# Altium schematic symbol library TI Power Management Shunt Voltage Reference.SchLib: 1526 symbols (part 1 of 18) (continued)
## LM285DRG4-1-2
designator U?
Micropower Voltage Reference, 1.235 V, 20 ppm / degC, 20 mA, -40 to 85 degC, 8-pin SOIC (D), Green (RoHS & no Sb/Br); Manufacturer: Texas Instruments; PartNumber: LM285DRG4-1-2; Initial Accuracy @ 25/deg C(%): 1; Iout/Iz(Max)(mA): 20; Min Iz for Regulation(uA): 10; Rating: Catalog; SubFamily: Shunt Voltage Reference; VO(V): 1.235; DatasheetVersion: SLVS075I; PackageVersion: 4040047-3/M; PackageReference: D8; PackageDescription: 8-Pin Plastic Small Outline, Body 4.9 x 3.9 mm, Pitch 1.27 mm; Supplier 1: Digi-Key; Supplier Part Number 1: LM285DRG4-1-2-ND; Supplier 2: Newark; Supplier Part Number 2: 41M3399; Supplier 3: Mouser; Supplier Part Number 3: 595-LM285DRG4-1-2; Eco-Plan: Green (RoHS & no Sb/Br); Temp Coeff(Typ)(ppm/ degree C): 20; Mounting Technology: Surface Mount; Code_JEDEC: MS-012; ComponentLink1Description: Manufacturer URL; ComponentLink1URL: http://www.ti.com/; ComponentLink2Description: Datasheet; ComponentLink2URL: http://www.ti.com/general/docs/lit/getliterature.tsp?genericPartNumber=LM285-1.2&fileType=pdf; ComponentLink3Description: Package Specification; ComponentLink3URL: http://www.ti.com/litv/pdf/msoi002j
footprint TI-D8_N (SOIC, 8-Leads, Body 4.9x3.9mm, Pitch 1.27mm, IPC Medium Density)
part A pins: 4 ANODE, 8 CATHODE
part B pins: 1 NC "No internal connection", 2 NC "No internal connection", 3 NC "No internal connection", 5 NC "No internal connection", 6 NC "No internal connection", 7 NC "No internal connection"

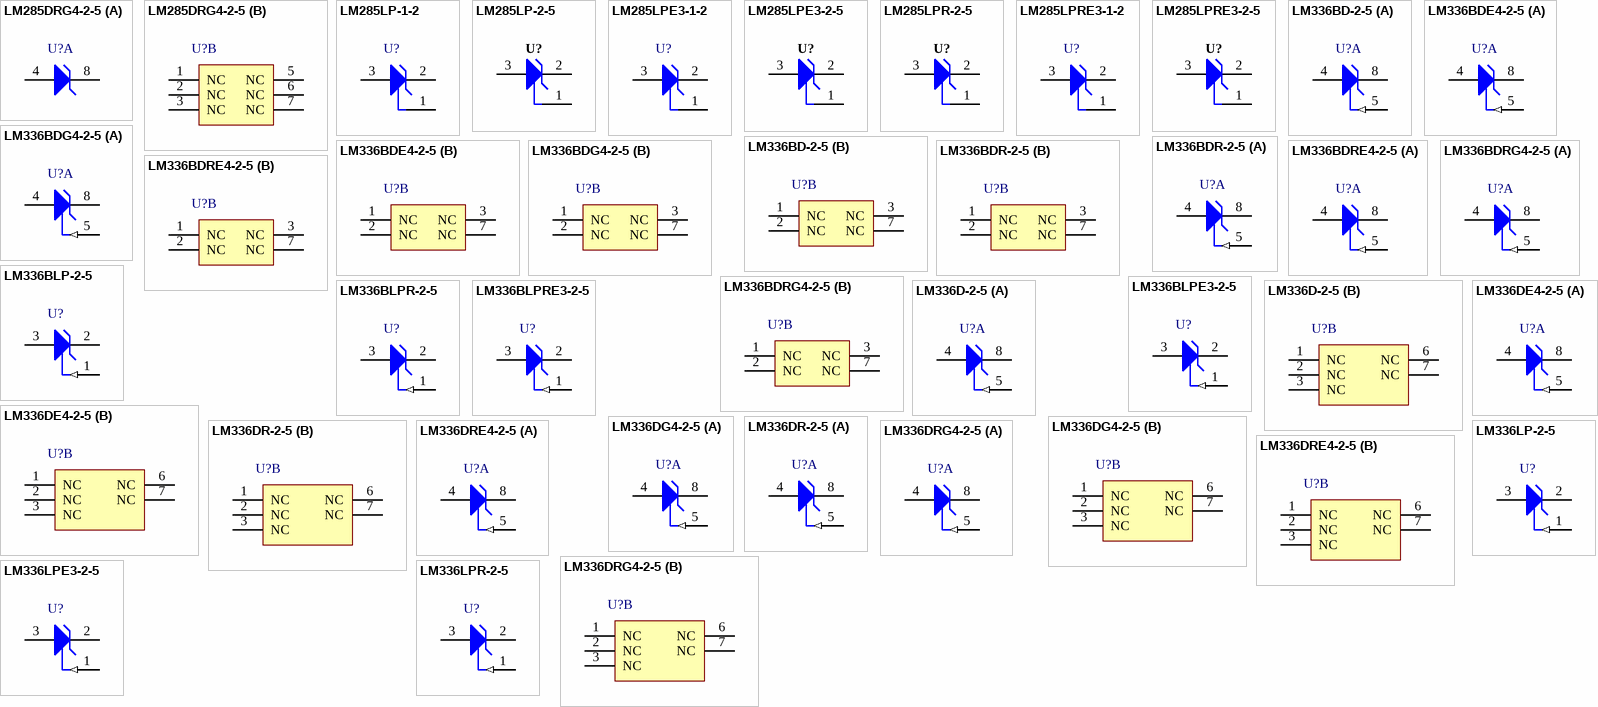
[diagram p1: symbols LM285DRG4-2-5 to LM336LPR-2-5]

## LM285DRG4-2-5
designator U?
Micropower Voltage Reference, 2.5 V, 20 ppm / degC, 20 mA, -40 to 85 degC, 8-pin SOIC (D), Green (RoHS & no Sb/Br); Manufacturer: Texas Instruments; PartNumber: LM285DRG4-2-5; Initial Accuracy @ 25/deg C(%): 1.5; Iout/Iz(Max)(mA): 20; Rating: Catalog; SubFamily: Shunt Voltage Reference; VO(V): 2.5; DatasheetVersion: SLVS023J; PackageVersion: 4040047-3/M; PackageReference: D8; PackageDescription: 8-Pin Plastic Small Outline, Body 4.9 x 3.9 mm, Pitch 1.27 mm; Supplier 1: Digi-Key; Supplier Part Number 1: LM285DRG4-2-5-ND; Supplier 2: Newark; Supplier Part Number 2: 41M3400; Supplier 3: Mouser; Supplier Part Number 3: 595-LM285DRG4-2-5; Eco-Plan: Green (RoHS & no Sb/Br); Min Iz for Regulation(uA): 20; Temp Coeff(Typ)(ppm/ degree C): 20; Mounting Technology: Surface Mount; Code_JEDEC: MS-012; ComponentLink1Description: Manufacturer URL; ComponentLink1URL: http://www.ti.com/; ComponentLink2Description: Datasheet; ComponentLink2URL: http://www.ti.com/general/docs/lit/getliterature.tsp?genericPartNumber=LM285-2.5&fileType=pdf; ComponentLink3Description: Package Specification; ComponentLink3URL: http://www.ti.com/litv/pdf/msoi002j
footprint TI-D8_N (SOIC, 8-Leads, Body 4.9x3.9mm, Pitch 1.27mm, IPC Medium Density)
part A pins: 4 ANODE, 8 CATHODE
part B pins: 1 NC "No internal connection", 2 NC "No internal connection", 3 NC "No internal connection", 5 NC "No internal connection", 6 NC "No internal connection", 7 NC "No internal connection"

## LM285LP-1-2
designator U?
Micropower Voltage Reference, 1.235 V, 20 ppm / degC, 20 mA, -40 to 85 degC, 3-pin TO-92 (LP), Pb-Free (RoHS); Manufacturer: Texas Instruments; PartNumber: LM285LP-1-2; Initial Accuracy @ 25/deg C(%): 1; Iout/Iz(Max)(mA): 20; Min Iz for Regulation(uA): 10; Rating: Catalog; SubFamily: Shunt Voltage Reference; VO(V): 1.235; DatasheetVersion: SLVS075I; PackageVersion: 4040001-2/C; PackageReference: LP3; PackageDescription: Plastic Cylindrical Package, Formed Lead Option (TO-92); Supplier 1: Digi-Key; Supplier Part Number 1: 296-9523-5-ND; Supplier 2: Newark; Supplier Part Number 2: 75C0755; Supplier 3: Mouser; Supplier Part Number 3: 595-LM285LP-1-2; Eco-Plan: Pb-Free (RoHS); Temp Coeff(Typ)(ppm/ degree C): 20; Mounting Technology: Through Hole; Code_JEDEC: TO-226; ComponentLink1Description: Manufacturer URL; ComponentLink1URL: http://www.ti.com/; ComponentLink2Description: Datasheet; ComponentLink2URL: http://www.ti.com/general/docs/lit/getliterature.tsp?genericPartNumber=LM285-1.2&fileType=pdf; ComponentLink3Description: Package Specification; ComponentLink3URL: http://www.ti.com/litv/pdf/msot002a
footprint TI-LP3 (TO, Flat Index; 3 In-Line, Formed Axial Leads; Body Dia. 4.8mm; Leads 0.56 x 0.41 mm (max))
pins: 1 NC, 2 CATHODE, 3 ANODE

## LM285LP-2-5
designator U?
Micropower Voltage Reference, 2.5 V, 20 ppm / degC, 20 mA, -40 to 85 degC, 3-pin TO-92 (LP), Pb-Free (RoHS); Manufacturer: Texas Instruments; PartNumber: LM285LP-2-5; Initial Accuracy @ 25/deg C(%): 1.5; Iout/Iz(Max)(mA): 20; Rating: Catalog; SubFamily: Shunt Voltage Reference; VO(V): 2.5; DatasheetVersion: SLVS023J; PackageVersion: 4040001-2/C; PackageReference: LP3; PackageDescription: Plastic Cylindrical Package, Formed Lead Option (TO-92); Supplier 1: Digi-Key; Supplier Part Number 1: 296-9524-5-ND; Supplier 2: Newark; Supplier Part Number 2: 75C0756; Supplier 3: Mouser; Supplier Part Number 3: 595-LM285LP-2-5; Eco-Plan: Pb-Free (RoHS); Min Iz for Regulation(uA): 20; Temp Coeff(Typ)(ppm/ degree C): 20; Mounting Technology: Through Hole; Code_JEDEC: TO-226; ComponentLink1Description: Manufacturer URL; ComponentLink1URL: http://www.ti.com/; ComponentLink2Description: Datasheet; ComponentLink2URL: http://www.ti.com/general/docs/lit/getliterature.tsp?genericPartNumber=LM285-2.5&fileType=pdf; ComponentLink3Description: Package Specification; ComponentLink3URL: http://www.ti.com/litv/pdf/msot002a
footprint TI-LP3 (TO, Flat Index; 3 In-Line, Formed Axial Leads; Body Dia. 4.8mm; Leads 0.56 x 0.41 mm (max))
pins: 1 NC, 2 CATHODE, 3 ANODE

## LM285LPE3-1-2
designator U?
Micropower Voltage Reference, 1.235 V, 20 ppm / degC, 20 mA, -40 to 85 degC, 3-pin TO-92 (LP), Pb-Free (RoHS); Manufacturer: Texas Instruments; PartNumber: LM285LPE3-1-2; Initial Accuracy @ 25/deg C(%): 1; Iout/Iz(Max)(mA): 20; Min Iz for Regulation(uA): 10; Rating: Catalog; SubFamily: Shunt Voltage Reference; VO(V): 1.235; DatasheetVersion: SLVS075I; PackageVersion: 4040001-2/C; PackageReference: LP3; PackageDescription: Plastic Cylindrical Package, Formed Lead Option (TO-92); Supplier 1: Digi-Key; Supplier Part Number 1: LM285LPE3-1-2-ND; Supplier 2: Newark; Supplier Part Number 2: 67K8067; Supplier 3: Mouser; Supplier Part Number 3: 595-LM285LPE3-1-2; Eco-Plan: Pb-Free (RoHS); Temp Coeff(Typ)(ppm/ degree C): 20; Mounting Technology: Through Hole; Code_JEDEC: TO-226; ComponentLink1Description: Manufacturer URL; ComponentLink1URL: http://www.ti.com/; ComponentLink2Description: Datasheet; ComponentLink2URL: http://www.ti.com/general/docs/lit/getliterature.tsp?genericPartNumber=LM285-1.2&fileType=pdf; ComponentLink3Description: Package Specification; ComponentLink3URL: http://www.ti.com/litv/pdf/msot002a
footprint TI-LP3 (TO, Flat Index; 3 In-Line, Formed Axial Leads; Body Dia. 4.8mm; Leads 0.56 x 0.41 mm (max))
pins: 1 NC, 2 CATHODE, 3 ANODE

## LM285LPE3-2-5
designator U?
Micropower Voltage Reference, 2.5 V, 20 ppm / degC, 20 mA, -40 to 85 degC, 3-pin TO-92 (LP), Pb-Free (RoHS); Manufacturer: Texas Instruments; PartNumber: LM285LPE3-2-5; Initial Accuracy @ 25/deg C(%): 1.5; Iout/Iz(Max)(mA): 20; Rating: Catalog; SubFamily: Shunt Voltage Reference; VO(V): 2.5; DatasheetVersion: SLVS023J; PackageVersion: 4040001-2/C; PackageReference: LP3; PackageDescription: Plastic Cylindrical Package, Formed Lead Option (TO-92); Supplier 1: Digi-Key; Supplier Part Number 1: LM285LPE3-2-5-ND; Supplier 2: Mouser; Supplier Part Number 2: 595-LM285LPE3-2-5; Eco-Plan: Pb-Free (RoHS); Min Iz for Regulation(uA): 20; Temp Coeff(Typ)(ppm/ degree C): 20; Mounting Technology: Through Hole; Code_JEDEC: TO-226; ComponentLink1Description: Manufacturer URL; ComponentLink1URL: http://www.ti.com/; ComponentLink2Description: Datasheet; ComponentLink2URL: http://www.ti.com/general/docs/lit/getliterature.tsp?genericPartNumber=LM285-2.5&fileType=pdf; ComponentLink3Description: Package Specification; ComponentLink3URL: http://www.ti.com/litv/pdf/msot002a
footprint TI-LP3 (TO, Flat Index; 3 In-Line, Formed Axial Leads; Body Dia. 4.8mm; Leads 0.56 x 0.41 mm (max))
pins: 1 NC, 2 CATHODE, 3 ANODE

## LM285LPR-2-5
designator U?
Micropower Voltage Reference, 2.5 V, 20 ppm / degC, 20 mA, -40 to 85 degC, 3-pin TO-92 (LP), Pb-Free (RoHS); Manufacturer: Texas Instruments; PartNumber: LM285LPR-2-5; Initial Accuracy @ 25/deg C(%): 1.5; Iout/Iz(Max)(mA): 20; Rating: Catalog; SubFamily: Shunt Voltage Reference; VO(V): 2.5; DatasheetVersion: SLVS023J; PackageVersion: 4040001-2/C; PackageReference: LP3; PackageDescription: Plastic Cylindrical Package, Formed Lead Option (TO-92); Supplier 1: Digi-Key; Supplier Part Number 1: 296-31449-2-ND; Supplier 2: Digi-Key; Supplier Part Number 2: 296-31449-1-ND; Supplier 3: Mouser; Supplier Part Number 3: 595-LM285LPR-2-5; Eco-Plan: Pb-Free (RoHS); Min Iz for Regulation(uA): 20; Temp Coeff(Typ)(ppm/ degree C): 20; Mounting Technology: Through Hole; Code_JEDEC: TO-226; ComponentLink1Description: Manufacturer URL; ComponentLink1URL: http://www.ti.com/; ComponentLink2Description: Datasheet; ComponentLink2URL: http://www.ti.com/general/docs/lit/getliterature.tsp?genericPartNumber=LM285-2.5&fileType=pdf; ComponentLink3Description: Package Specification; ComponentLink3URL: http://www.ti.com/litv/pdf/msot002a
footprint TI-LP3 (TO, Flat Index; 3 In-Line, Formed Axial Leads; Body Dia. 4.8mm; Leads 0.56 x 0.41 mm (max))
pins: 1 NC, 2 CATHODE, 3 ANODE

## LM285LPRE3-1-2
designator U?
Micropower Voltage Reference, 1.235 V, 20 ppm / degC, 20 mA, -40 to 85 degC, 3-pin TO-92 (LP), Pb-Free (RoHS); Manufacturer: Texas Instruments; PartNumber: LM285LPRE3-1-2; Initial Accuracy @ 25/deg C(%): 1; Iout/Iz(Max)(mA): 20; Min Iz for Regulation(uA): 10; Rating: Catalog; SubFamily: Shunt Voltage Reference; VO(V): 1.235; DatasheetVersion: SLVS075I; PackageVersion: 4040001-2/C; PackageReference: LP3; PackageDescription: Plastic Cylindrical Package, Formed Lead Option (TO-92); Supplier 1: Digi-Key; Supplier Part Number 1: LM285LPRE3-1-2-ND; Supplier 2: Newark; Supplier Part Number 2: 67K8068; Supplier 3: Mouser; Supplier Part Number 3: 595-LM285LPRE3-1-2; Eco-Plan: Pb-Free (RoHS); Temp Coeff(Typ)(ppm/ degree C): 20; Mounting Technology: Through Hole; Code_JEDEC: TO-226; ComponentLink1Description: Manufacturer URL; ComponentLink1URL: http://www.ti.com/; ComponentLink2Description: Datasheet; ComponentLink2URL: http://www.ti.com/general/docs/lit/getliterature.tsp?genericPartNumber=LM285-1.2&fileType=pdf; ComponentLink3Description: Package Specification; ComponentLink3URL: http://www.ti.com/litv/pdf/msot002a
footprint TI-LP3 (TO, Flat Index; 3 In-Line, Formed Axial Leads; Body Dia. 4.8mm; Leads 0.56 x 0.41 mm (max))
pins: 1 NC, 2 CATHODE, 3 ANODE

## LM285LPRE3-2-5
designator U?
Micropower Voltage Reference, 2.5 V, 20 ppm / degC, 20 mA, -40 to 85 degC, 3-pin TO-92 (LP), Pb-Free (RoHS); Manufacturer: Texas Instruments; PartNumber: LM285LPRE3-2-5; Initial Accuracy @ 25/deg C(%): 1.5; Iout/Iz(Max)(mA): 20; Rating: Catalog; SubFamily: Shunt Voltage Reference; VO(V): 2.5; DatasheetVersion: SLVS023J; PackageVersion: 4040001-2/C; PackageReference: LP3; PackageDescription: Plastic Cylindrical Package, Formed Lead Option (TO-92); Supplier 1: Digi-Key; Supplier Part Number 1: LM285LPRE3-2-5-ND; Supplier 2: Mouser; Supplier Part Number 2: 595-LM285LPRE3-2-5; Eco-Plan: Pb-Free (RoHS); Min Iz for Regulation(uA): 20; Temp Coeff(Typ)(ppm/ degree C): 20; Mounting Technology: Through Hole; Code_JEDEC: TO-226; ComponentLink1Description: Manufacturer URL; ComponentLink1URL: http://www.ti.com/; ComponentLink2Description: Datasheet; ComponentLink2URL: http://www.ti.com/general/docs/lit/getliterature.tsp?genericPartNumber=LM285-2.5&fileType=pdf; ComponentLink3Description: Package Specification; ComponentLink3URL: http://www.ti.com/litv/pdf/msot002a
footprint TI-LP3 (TO, Flat Index; 3 In-Line, Formed Axial Leads; Body Dia. 4.8mm; Leads 0.56 x 0.41 mm (max))
pins: 1 NC, 2 CATHODE, 3 ANODE

## LM336BD-2-5
designator U?
Precision Voltage Reference, 2.49 V, 10 ppm / degC, 10 mA, 0 to 70 degC, 8-pin SOIC (D), Green (RoHS & no Sb/Br); Manufacturer: Texas Instruments; PartNumber: LM336BD-2-5; Initial Accuracy @ 25/deg C(%): 1; Iout/Iz(Max)(mA): 10; Min Iz for Regulation(uA): 400; Rating: Catalog; SubFamily: Shunt Voltage Reference; Temp Coeff(Max)(ppm/ degree C): 34; VO(V): 2.49; DatasheetVersion: SLVS063E; PackageVersion: 4040047-3/M; PackageReference: D8; PackageDescription: 8-Pin Plastic Small Outline, Body 4.9 x 3.9 mm, Pitch 1.27 mm; Supplier 1: Digi-Key; Supplier Part Number 1: 296-9547-5-ND; Supplier 2: Newark; Supplier Part Number 2: 67K2802; Supplier 3: Mouser; Supplier Part Number 3: 595-LM336BD-2-5; Eco-Plan: Green (RoHS & no Sb/Br); Temp Coeff(Typ)(ppm/ degree C): 10; Mounting Technology: Surface Mount; Code_JEDEC: MS-012; ComponentLink1Description: Manufacturer URL; ComponentLink1URL: http://www.ti.com/; ComponentLink2Description: Datasheet; ComponentLink2URL: http://www.ti.com/general/docs/lit/getliterature.tsp?genericPartNumber=LM336B-2.5&fileType=pdf; ComponentLink3Description: Package Specification; ComponentLink3URL: http://www.ti.com/litv/pdf/msoi002j; ComponentLink4Description: URL Link1; ComponentLink4URL: Samples URL:http://www.ti.com/product/lm336b-2.5
footprint TI-D8_N (SOIC, 8-Leads, Body 4.9x3.9mm, Pitch 1.27mm, IPC Medium Density)
part A pins: 4 ANODE, 5 ADJ (in), 8 CATHODE
part B pins: 1 NC "No internal connection", 2 NC "No internal connection", 3 NC "No internal connection", 7 NC "No internal connection"

## LM336BDE4-2-5
designator U?
Precision Voltage Reference, 2.49 V, 10 ppm / degC, 10 mA, 0 to 70 degC, 8-pin SOIC (D), Green (RoHS & no Sb/Br); Manufacturer: Texas Instruments; PartNumber: LM336BDE4-2-5; Initial Accuracy @ 25/deg C(%): 1; Iout/Iz(Max)(mA): 10; Min Iz for Regulation(uA): 400; Rating: Catalog; SubFamily: Shunt Voltage Reference; Temp Coeff(Max)(ppm/ degree C): 34; VO(V): 2.49; DatasheetVersion: SLVS063E; PackageVersion: 4040047-3/M; PackageReference: D8; PackageDescription: 8-Pin Plastic Small Outline, Body 4.9 x 3.9 mm, Pitch 1.27 mm; Supplier 1: Digi-Key; Supplier Part Number 1: LM336BDE4-2-5-ND; Supplier 2: Mouser; Supplier Part Number 2: 595-LM336BDE4-2-5; Eco-Plan: Green (RoHS & no Sb/Br); Temp Coeff(Typ)(ppm/ degree C): 10; Mounting Technology: Surface Mount; Code_JEDEC: MS-012; ComponentLink1Description: Manufacturer URL; ComponentLink1URL: http://www.ti.com/; ComponentLink2Description: Datasheet; ComponentLink2URL: http://www.ti.com/general/docs/lit/getliterature.tsp?genericPartNumber=LM336B-2.5&fileType=pdf; ComponentLink3Description: Package Specification; ComponentLink3URL: http://www.ti.com/litv/pdf/msoi002j; ComponentLink4Description: URL Link1; ComponentLink4URL: Samples URL:http://www.ti.com/product/lm336b-2.5
footprint TI-D8_N (SOIC, 8-Leads, Body 4.9x3.9mm, Pitch 1.27mm, IPC Medium Density)
part A pins: 4 ANODE, 5 ADJ (in), 8 CATHODE
part B pins: 1 NC "No internal connection", 2 NC "No internal connection", 3 NC "No internal connection", 7 NC "No internal connection"

## LM336BDG4-2-5
designator U?
Precision Voltage Reference, 2.49 V, 10 ppm / degC, 10 mA, 0 to 70 degC, 8-pin SOIC (D), Green (RoHS & no Sb/Br); Manufacturer: Texas Instruments; PartNumber: LM336BDG4-2-5; Initial Accuracy @ 25/deg C(%): 1; Iout/Iz(Max)(mA): 10; Min Iz for Regulation(uA): 400; Rating: Catalog; SubFamily: Shunt Voltage Reference; Temp Coeff(Max)(ppm/ degree C): 34; VO(V): 2.49; DatasheetVersion: SLVS063E; PackageVersion: 4040047-3/M; PackageReference: D8; PackageDescription: 8-Pin Plastic Small Outline, Body 4.9 x 3.9 mm, Pitch 1.27 mm; Supplier 1: Digi-Key; Supplier Part Number 1: LM336BDG4-2-5-ND; Supplier 2: Newark; Supplier Part Number 2: 41M3417; Supplier 3: Mouser; Supplier Part Number 3: 595-LM336BDG4-2-5; Eco-Plan: Green (RoHS & no Sb/Br); Temp Coeff(Typ)(ppm/ degree C): 10; Mounting Technology: Surface Mount; Code_JEDEC: MS-012; ComponentLink1Description: Manufacturer URL; ComponentLink1URL: http://www.ti.com/; ComponentLink2Description: Datasheet; ComponentLink2URL: http://www.ti.com/general/docs/lit/getliterature.tsp?genericPartNumber=LM336B-2.5&fileType=pdf; ComponentLink3Description: Package Specification; ComponentLink3URL: http://www.ti.com/litv/pdf/msoi002j; ComponentLink4Description: URL Link1; ComponentLink4URL: Samples URL:http://www.ti.com/product/lm336b-2.5
footprint TI-D8_N (SOIC, 8-Leads, Body 4.9x3.9mm, Pitch 1.27mm, IPC Medium Density)
part A pins: 4 ANODE, 5 ADJ (in), 8 CATHODE
part B pins: 1 NC "No internal connection", 2 NC "No internal connection", 3 NC "No internal connection", 7 NC "No internal connection"

## LM336BDR-2-5
designator U?
Precision Voltage Reference, 2.49 V, 10 ppm / degC, 10 mA, 0 to 70 degC, 8-pin SOIC (D), Green (RoHS & no Sb/Br); Manufacturer: Texas Instruments; PartNumber: LM336BDR-2-5; Initial Accuracy @ 25/deg C(%): 2; Iout/Iz(Max)(mA): 10; Min Iz for Regulation(uA): 400; Rating: Catalog; SubFamily: Shunt Voltage Reference; Temp Coeff(Max)(ppm/ degree C): 34; VO(V): 2.49; DatasheetVersion: SLVS063E; PackageVersion: 4040047-3/M; PackageReference: D8; PackageDescription: 8-Pin Plastic Small Outline, Body 4.9 x 3.9 mm, Pitch 1.27 mm; Supplier 1: Digi-Key; Supplier Part Number 1: LM336BDR-2-5-ND; Supplier 2: Mouser; Supplier Part Number 2: 595-LM336BDR-2-5; Eco-Plan: Green (RoHS & no Sb/Br); Temp Coeff(Typ)(ppm/ degree C): 10; Mounting Technology: Surface Mount; Code_JEDEC: MS-012; ComponentLink1Description: Manufacturer URL; ComponentLink1URL: http://www.ti.com/; ComponentLink2Description: Datasheet; ComponentLink2URL: http://www.ti.com/general/docs/lit/getliterature.tsp?genericPartNumber=LM336B-2.5&fileType=pdf; ComponentLink3Description: Package Specification; ComponentLink3URL: http://www.ti.com/litv/pdf/msoi002j; ComponentLink4Description: URL Link1; ComponentLink4URL: Samples URL:http://www.ti.com/product/lm336b-2.5
footprint TI-D8_N (SOIC, 8-Leads, Body 4.9x3.9mm, Pitch 1.27mm, IPC Medium Density)
part A pins: 4 ANODE, 5 ADJ (in), 8 CATHODE
part B pins: 1 NC "No internal connection", 2 NC "No internal connection", 3 NC "No internal connection", 7 NC "No internal connection"

## LM336BDRE4-2-5
designator U?
Precision Voltage Reference, 2.49 V, 10 ppm / degC, 10 mA, 0 to 70 degC, 8-pin SOIC (D), Green (RoHS & no Sb/Br); Manufacturer: Texas Instruments; PartNumber: LM336BDRE4-2-5; Iout/Iz(Max)(mA): 10; Min Iz for Regulation(uA): 400; Rating: Catalog; SubFamily: Shunt Voltage Reference; Temp Coeff(Max)(ppm/ degree C): 34; VO(V): 2.49; DatasheetVersion: SLVS063E; PackageVersion: 4040047-3/M; PackageReference: D8; PackageDescription: 8-Pin Plastic Small Outline, Body 4.9 x 3.9 mm, Pitch 1.27 mm; Supplier 1: Digi-Key; Supplier Part Number 1: LM336BDRE4-2-5-ND; Supplier 2: Mouser; Supplier Part Number 2: 595-LM336BDRE4-2-5; Eco-Plan: Green (RoHS & no Sb/Br); Temp Coeff(Typ)(ppm/ degree C): 10; Mounting Technology: Surface Mount; Code_JEDEC: MS-012; ComponentLink1Description: Manufacturer URL; ComponentLink1URL: http://www.ti.com/; ComponentLink2Description: Datasheet; ComponentLink2URL: http://www.ti.com/general/docs/lit/getliterature.tsp?genericPartNumber=LM336B-2.5&fileType=pdf; ComponentLink3Description: Package Specification; ComponentLink3URL: http://www.ti.com/litv/pdf/msoi002j; ComponentLink4Description: URL Link1; ComponentLink4URL: Samples URL:http://www.ti.com/product/lm336b-2.5
footprint TI-D8_N (SOIC, 8-Leads, Body 4.9x3.9mm, Pitch 1.27mm, IPC Medium Density)
part A pins: 4 ANODE, 5 ADJ (in), 8 CATHODE
part B pins: 1 NC "No internal connection", 2 NC "No internal connection", 3 NC "No internal connection", 7 NC "No internal connection"

## LM336BDRG4-2-5
designator U?
Precision Voltage Reference, 2.49 V, 10 ppm / degC, 10 mA, 0 to 70 degC, 8-pin SOIC (D), Green (RoHS & no Sb/Br); Manufacturer: Texas Instruments; PartNumber: LM336BDRG4-2-5; Iout/Iz(Max)(mA): 10; Min Iz for Regulation(uA): 400; Rating: Catalog; SubFamily: Shunt Voltage Reference; Temp Coeff(Max)(ppm/ degree C): 34; VO(V): 2.49; DatasheetVersion: SLVS063E; PackageVersion: 4040047-3/M; PackageReference: D8; PackageDescription: 8-Pin Plastic Small Outline, Body 4.9 x 3.9 mm, Pitch 1.27 mm; Supplier 1: Digi-Key; Supplier Part Number 1: LM336BDRG4-2-5-ND; Supplier 2: Newark; Supplier Part Number 2: 41M3418; Supplier 3: Mouser; Supplier Part Number 3: 595-LM336BDRG4-2-5; Eco-Plan: Green (RoHS & no Sb/Br); Temp Coeff(Typ)(ppm/ degree C): 10; Mounting Technology: Surface Mount; Code_JEDEC: MS-012; ComponentLink1Description: Manufacturer URL; ComponentLink1URL: http://www.ti.com/; ComponentLink2Description: Datasheet; ComponentLink2URL: http://www.ti.com/general/docs/lit/getliterature.tsp?genericPartNumber=LM336B-2.5&fileType=pdf; ComponentLink3Description: Package Specification; ComponentLink3URL: http://www.ti.com/litv/pdf/msoi002j; ComponentLink4Description: URL Link1; ComponentLink4URL: Samples URL:http://www.ti.com/product/lm336b-2.5
footprint TI-D8_N (SOIC, 8-Leads, Body 4.9x3.9mm, Pitch 1.27mm, IPC Medium Density)
part A pins: 4 ANODE, 5 ADJ (in), 8 CATHODE
part B pins: 1 NC "No internal connection", 2 NC "No internal connection", 3 NC "No internal connection", 7 NC "No internal connection"

## LM336BLP-2-5
designator U?
Precision Voltage Reference, 10 ppm / degC, 10 mA, 0 to 70 degC, 3-pin TO-92 (LP), Pb-Free (RoHS); Manufacturer: Texas Instruments; PartNumber: LM336BLP-2-5; Initial Accuracy @ 25/deg C(%): 2; Iout/Iz(Max)(mA): 10; Min Iz for Regulation(uA): 400; Rating: Catalog; SubFamily: Shunt Voltage Reference; Temp Coeff(Max)(ppm/ degree C): 34; VO(V): 2.49; DatasheetVersion: SLVS063E; PackageVersion: 4040001-2/C; PackageReference: LP3; PackageDescription: Plastic Cylindrical Package, Formed Lead Option (TO-92); Supplier 1: Digi-Key; Supplier Part Number 1: 296-9548-5-ND; Supplier 2: Newark; Supplier Part Number 2: 06F9354; Supplier 3: Mouser; Supplier Part Number 3: 595-LM336BLP-2-5; Eco-Plan: Pb-Free (RoHS); Temp Coeff(Typ)(ppm/ degree C): 10; Mounting Technology: Through Hole; Code_JEDEC: TO-226; ComponentLink1Description: Manufacturer URL; ComponentLink1URL: http://www.ti.com/; ComponentLink2Description: Datasheet; ComponentLink2URL: http://www.ti.com/general/docs/lit/getliterature.tsp?genericPartNumber=LM336B-2.5&fileType=pdf; ComponentLink3Description: Package Specification; ComponentLink3URL: http://www.ti.com/litv/pdf/msot002a; ComponentLink4Description: URL Link1; ComponentLink4URL: Samples URL:http://www.ti.com/product/lm336b-2.5
footprint TI-LP3 (TO, Flat Index; 3 In-Line, Formed Axial Leads; Body Dia. 4.8mm; Leads 0.56 x 0.41 mm (max))
pins: 1 ADJ (in), 2 CATHODE, 3 ANODE

## LM336BLPE3-2-5
designator U?
Integrated Reference Circuit, 2.5 V, 10 ppm / degC, 10 mA, 0 to 70 degC, 3-pin TO-92 (LP), Pb-Free (RoHS); Manufacturer: Texas Instruments; PartNumber: LM336BLPE3-2-5; Iout/Iz(Max)(mA): 10; Min Iz for Regulation(uA): 400; Rating: Catalog; SubFamily: Shunt Voltage Reference; Temp Coeff(Max)(ppm/ degree C): 34; VO(V): 2.49; DatasheetVersion: SLVS063E; PackageVersion: 4040001-2/C; PackageReference: LP3; PackageDescription: Plastic Cylindrical Package, Formed Lead Option (TO-92); Supplier 1: Digi-Key; Supplier Part Number 1: LM336BLPE3-2-5-ND; Supplier 2: Mouser; Supplier Part Number 2: 595-LM336BLPE3-2-5; Eco-Plan: Pb-Free (RoHS); Temp Coeff(Typ)(ppm/ degree C): 10; Mounting Technology: Through Hole; Code_JEDEC: TO-226; ComponentLink1Description: Manufacturer URL; ComponentLink1URL: http://www.ti.com/; ComponentLink2Description: Datasheet; ComponentLink2URL: http://www.ti.com/general/docs/lit/getliterature.tsp?genericPartNumber=LM336-2.5&fileType=pdf; ComponentLink3Description: Package Specification; ComponentLink3URL: http://www.ti.com/litv/pdf/msot002a; ComponentLink4Description: URL Link1; ComponentLink4URL: Samples URL:http://www.ti.com/product/LM336-2.5
footprint TI-LP3 (TO, Flat Index; 3 In-Line, Formed Axial Leads; Body Dia. 4.8mm; Leads 0.56 x 0.41 mm (max))
pins: 1 ADJ (in), 2 CATHODE, 3 ANODE

## LM336BLPR-2-5
designator U?
Precision Voltage Reference, 10 ppm / degC, 10 mA, 0 to 70 degC, 3-pin TO-92 (LP), Pb-Free (RoHS); Manufacturer: Texas Instruments; PartNumber: LM336BLPR-2-5; Initial Accuracy @ 25/deg C(%): 1; Iout/Iz(Max)(mA): 10; Min Iz for Regulation(uA): 400; Rating: Catalog; SubFamily: Shunt Voltage Reference; Temp Coeff(Max)(ppm/ degree C): 34; VO(V): 2.49; DatasheetVersion: SLVS063E; PackageVersion: 4040001-2/C; PackageReference: LP3; PackageDescription: Plastic Cylindrical Package, Formed Lead Option (TO-92); Supplier 1: Digi-Key; Supplier Part Number 1: LM336BLPR-2-5-ND; Supplier 2: Mouser; Supplier Part Number 2: 595-LM336BLPR-2-5; Eco-Plan: Pb-Free (RoHS); Temp Coeff(Typ)(ppm/ degree C): 10; Mounting Technology: Through Hole; Code_JEDEC: TO-226; ComponentLink1Description: Manufacturer URL; ComponentLink1URL: http://www.ti.com/; ComponentLink2Description: Datasheet; ComponentLink2URL: http://www.ti.com/general/docs/lit/getliterature.tsp?genericPartNumber=LM336B-2.5&fileType=pdf; ComponentLink3Description: Package Specification; ComponentLink3URL: http://www.ti.com/litv/pdf/msot002a; ComponentLink4Description: URL Link1; ComponentLink4URL: Samples URL:http://www.ti.com/product/lm336b-2.5
footprint TI-LP3 (TO, Flat Index; 3 In-Line, Formed Axial Leads; Body Dia. 4.8mm; Leads 0.56 x 0.41 mm (max))
pins: 1 ADJ (in), 2 CATHODE, 3 ANODE

## LM336BLPRE3-2-5
designator U?
Integrated Reference Circuit, 2.5 V, 10 ppm / degC, 10 mA, 0 to 70 degC, 3-pin TO-92 (LP), Pb-Free (RoHS); Manufacturer: Texas Instruments; PartNumber: LM336BLPRE3-2-5; Initial Accuracy @ 25/deg C(%): 1; Iout/Iz(Max)(mA): 10; Min Iz for Regulation(uA): 400; Rating: Catalog; SubFamily: Shunt Voltage Reference; Temp Coeff(Max)(ppm/ degree C): 34; VO(V): 2.49; DatasheetVersion: SLVS063E; PackageVersion: 4040001-2/C; PackageReference: LP3; PackageDescription: Plastic Cylindrical Package, Formed Lead Option (TO-92); Supplier 1: Digi-Key; Supplier Part Number 1: LM336BLPRE3-2-5-ND; Supplier 2: Mouser; Supplier Part Number 2: 595-LM336BLPRE3-2-5; Eco-Plan: Pb-Free (RoHS); Temp Coeff(Typ)(ppm/ degree C): 10; Mounting Technology: Through Hole; Code_JEDEC: TO-226; ComponentLink1Description: Manufacturer URL; ComponentLink1URL: http://www.ti.com/; ComponentLink2Description: Datasheet; ComponentLink2URL: http://www.ti.com/general/docs/lit/getliterature.tsp?genericPartNumber=LM336-2.5&fileType=pdf; ComponentLink3Description: Package Specification; ComponentLink3URL: http://www.ti.com/litv/pdf/msot002a
footprint TI-LP3 (TO, Flat Index; 3 In-Line, Formed Axial Leads; Body Dia. 4.8mm; Leads 0.56 x 0.41 mm (max))
pins: 1 ADJ (in), 2 CATHODE, 3 ANODE

## LM336D-2-5
designator U?
Integrated Reference Circuit, 2.5 V, 10 ppm / degC, 10 mA, 0 to 70 degC, 8-pin SOIC (D), Green (RoHS & no Sb/Br); Manufacturer: Texas Instruments; PartNumber: LM336D-2-5; Initial Accuracy @ 25/deg C(%): 4; Iout/Iz(Max)(mA): 10; Min Iz for Regulation(uA): 400; Rating: Catalog; SubFamily: Shunt Voltage Reference; Temp Coeff(Max)(ppm/ degree C): 34; VO(V): 2.49; DatasheetVersion: SLVS063E; PackageVersion: 4040047-3/M; PackageReference: D8; PackageDescription: 8-Pin Plastic Small Outline, Body 4.9 x 3.9 mm, Pitch 1.27 mm; Supplier 1: Digi-Key; Supplier Part Number 1: 296-9549-5-ND; Supplier 2: Newark; Supplier Part Number 2: 06F9355; Supplier 3: Mouser; Supplier Part Number 3: 595-LM336D-2-5; Eco-Plan: Green (RoHS & no Sb/Br); Temp Coeff(Typ)(ppm/ degree C): 10; Mounting Technology: Surface Mount; Code_JEDEC: MS-012; ComponentLink1Description: Manufacturer URL; ComponentLink1URL: http://www.ti.com/; ComponentLink2Description: Datasheet; ComponentLink2URL: http://www.ti.com/general/docs/lit/getliterature.tsp?genericPartNumber=LM336-2.5&fileType=pdf; ComponentLink3Description: Package Specification; ComponentLink3URL: http://www.ti.com/litv/pdf/msoi002j
footprint TI-D8_N (SOIC, 8-Leads, Body 4.9x3.9mm, Pitch 1.27mm, IPC Medium Density)
part A pins: 4 ANODE, 5 ADJ (in), 8 CATHODE
part B pins: 1 NC "No internal connection", 2 NC "No internal connection", 3 NC "No internal connection", 6 NC "No internal connection", 7 NC "No internal connection"
